# Altium footprint library Semi-ATE.PcbLib: 155 footprints (part 2 of 10)
Each footprint in its own frame and in the unit in brackets; x right, y up, seen from the top. Pads: shape width x height; smd on the part's side, far side on the other; paste and mask are expansions set on the pad; w line width, h text height; cw(c..) or ccw(c..) is an arc to the next point about the centre after c.
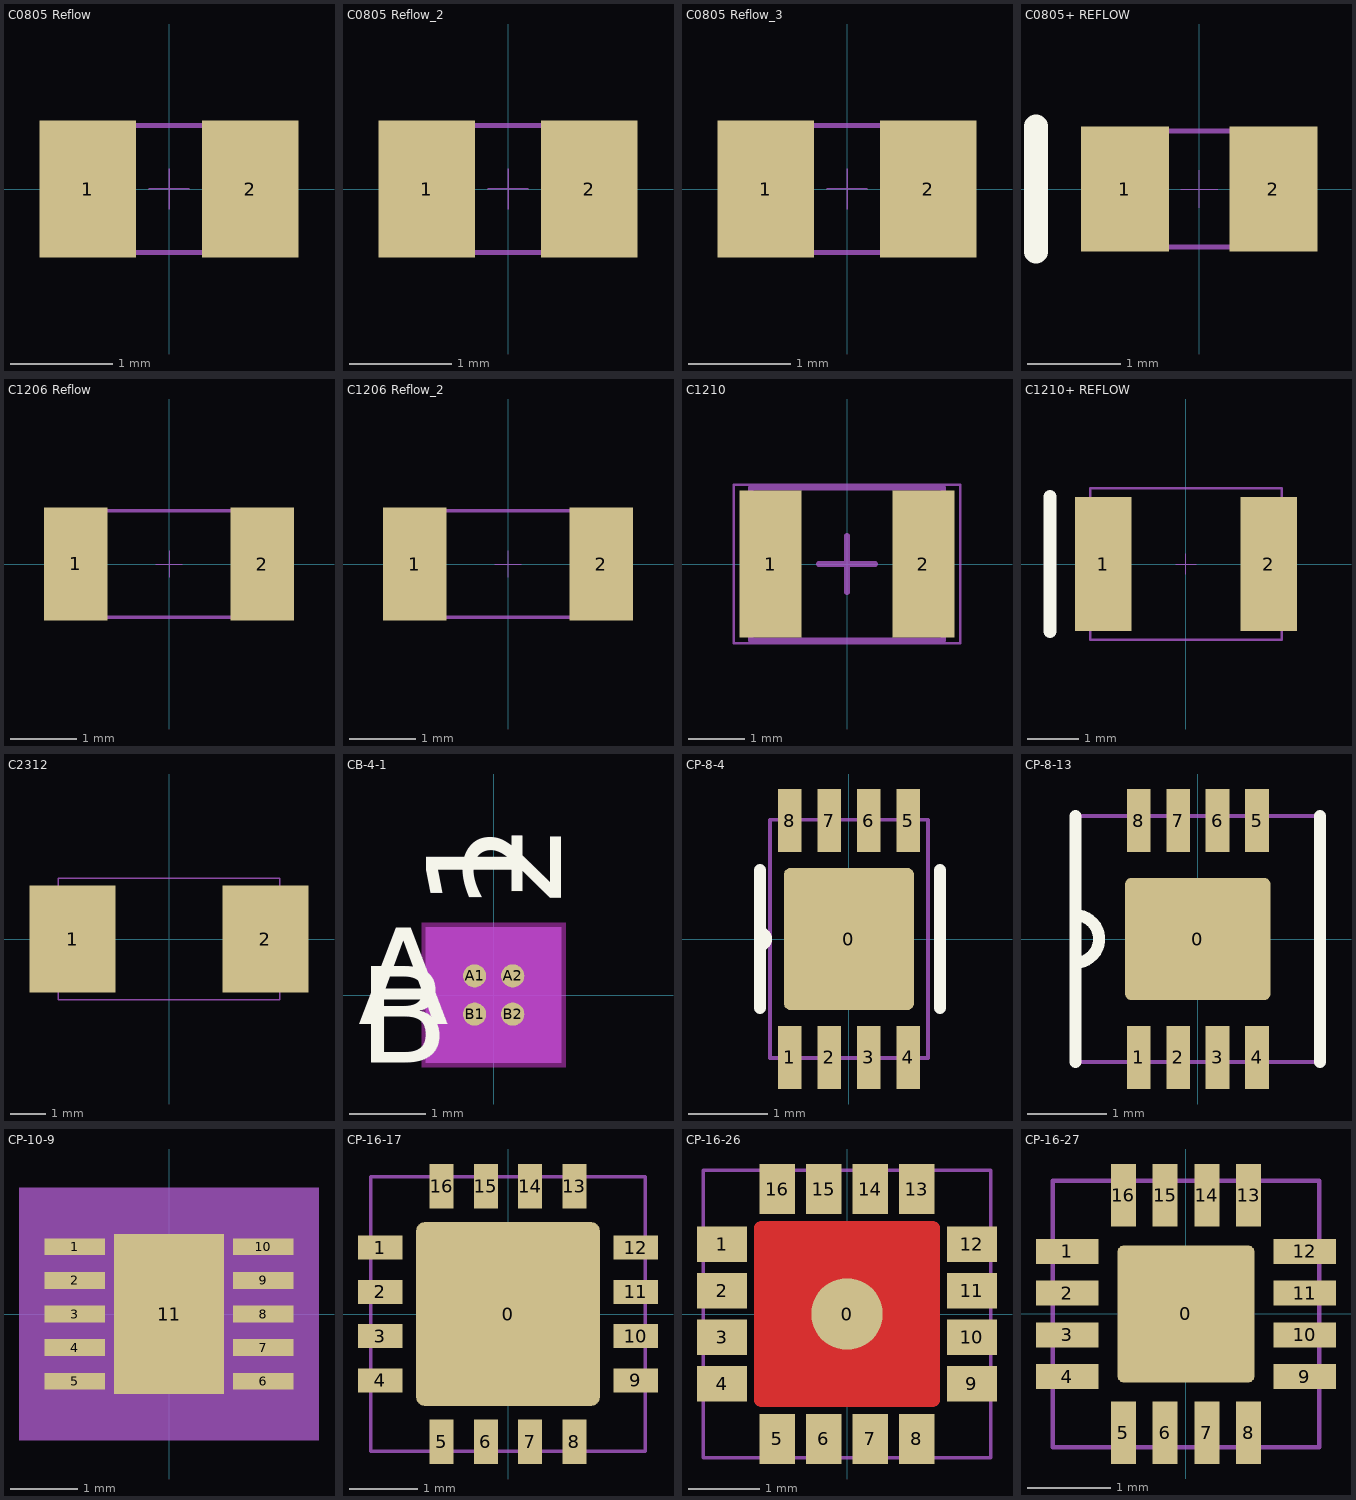
[diagram p1: the footprints below, top view; thin cyan lines are the x and y axes]

## C0805 Reflow [mm] "SMT Capacitor 0805 Reflow Soldering"
height 10
pads (2):
  rect 0.95x1.35 smd: 1(-0.8,0) 2(0.8,0)
Top Designator:
  text ".Designator" at -7.618,-0.508 h1.52
Top 3D Body:
  lines w0.05: -1,-0.625 1,-0.625 1,0.625 -1,0.625 -1,-0.625
Bottom Gold Plating:
  lines w0.013: -0.2,0 0.2,0 ; 0,-0.2 0,0.2
3D body "C0805.STEP": height 0.6, standoff 0, extent -1,-0.625 1,0.625

## C0805 Reflow_2 [mm]
pads (2):
  rect 0.95x1.35 smd: 1(-0.8,0) 2(0.8,0)
Top Designator:
  text ".Designator" at -7.618,-0.508 h1.52
Top 3D Body:
  lines w0.05: -1,-0.625 1,-0.625 1,0.625 -1,0.625 -1,-0.625
Bottom Gold Plating:
  lines w0.013: -0.2,0 0.2,0 ; 0,-0.2 0,0.2
3D body "C0805.STEP": height 0.6, standoff 0, extent -1,-0.625 1,0.625

## C0805 Reflow_3 [mm]
pads (2):
  rect 0.95x1.35 smd: 1(-0.8,0) 2(0.8,0)
Top Designator:
  text ".Designator" at -7.618,-0.508 h1.52
Top 3D Body:
  lines w0.05: -1,-0.625 1,-0.625 1,0.625 -1,0.625 -1,-0.625
Bottom Gold Plating:
  lines w0.013: -0.2,0 0.2,0 ; 0,-0.2 0,0.2
3D body "C0805.STEP": height 0.6, standoff 0, extent -1,-0.625 1,0.625

## C0805+ REFLOW [mm] "SMT Capacitor 0805 Polarized Reflow Soldering"
pads (2):
  rect 0.95x1.35 smd: 1(-0.8,0) 2(0.8,0)
Top Overlay:
  lines w0.254: -1.758,-0.675 -1.758,0.675
Top Designator:
  text ".Designator" at -7.872,-0.508 h1.52
Top 3D Body:
  lines w0.05: -1,-0.625 1,-0.625 1,0.625 -1,0.625 -1,-0.625
Bottom Gold Plating:
  lines w0.013: -0.2,0 0.2,0 ; 0,-0.2 0,0.2
3D body "C0805.STEP": height 0.6, standoff 0, extent -1,-0.625 1,0.625

## C1206 Reflow [mm] "SMT Capacitor 1206 Reflow Soldering"
height 1.35
pads (2):
  rect 0.95x1.7 smd: 1(-1.4,0) 2(1.4,0)
Top Designator:
  text ".Designator" at -7.618,-0.508 h1.52
Top 3D Body:
  lines w0.05: -1.6,-0.8 -1.6,0.8 1.6,0.8 1.6,-0.8 -1.6,-0.8
Bottom Gold Plating:
  lines w0.013: -0.2,0 0.2,0 ; 0,-0.2 0,0.2
3D body "C1206.STEP": height 0.78, standoff 0, extent -1.6,-0.8 1.6,0.8

## C1206 Reflow_2 [mm]
pads (2):
  rect 0.95x1.7 smd: 1(-1.4,0) 2(1.4,0)
Top Designator:
  text ".Designator" at -7.618,-0.508 h1.52
Top 3D Body:
  lines w0.05: -1.6,-0.8 -1.6,0.8 1.6,0.8 1.6,-0.8 -1.6,-0.8
Bottom Gold Plating:
  lines w0.013: -0.2,0 0.2,0 ; 0,-0.2 0,0.2
3D body "C1206.STEP": height 0.78, standoff 0, extent -1.6,-0.8 1.6,0.8

## C1210 [mm] "Chip Capacitor; Body 3.2x2.5mm (LxW typ), IPC High Density"
height 1.35
pads (2):
  rect 1.1x2.6 smd: 1(-1.35,0) 2(1.35,0)
Top Designator:
  text ".Designator" at -7.618,-0.508 h1.52
Top 3D Body:
  lines w0.05: -2,-1.4 2,-1.4 2,1.4 -2,1.4 -2,-1.4
Bottom 3D Body:
  lines w0.1: -1.7,-1.35 1.7,-1.35 1.7,1.35 -1.7,1.35 -1.7,-1.35
Bottom Gold Plating:
  lines w0.1: -0.5,0 0.5,0 ; 0,-0.5 0,0.5
3D body: height 1.35, standoff 0, extent -1.7,-1.35 1.7,1.35

## C1210+ REFLOW [mm] "SMT Capacitor 1210 Polarized Reflow Soldering"
pads (2):
  rect 1.1x2.6 smd: 1(-1.6,0) 2(1.6,0)
Top Overlay:
  lines w0.254: -2.633,-1.3 -2.633,1.3
Top Designator:
  text ".Designator" at -7.871,-0.508 h1.52
Top 3D Body:
  lines w0.05: -1.85,-1.465 1.85,-1.465 1.85,1.465 -1.85,1.465 -1.85,-1.465
Bottom Gold Plating:
  lines w0.013: -0.2,0 0.2,0 ; 0,-0.2 0,0.2
3D body "C1210+.STEP": height 2.03, standoff 0, extent -1.85,-1.465 1.85,1.465

## C2312 [mm] "SMT 2312 Tantalum"
pads (2):
  rect 2.4x3 smd: 1(-2.7,0) 2(2.7,0)
Top Overlay:
  text "." at -2.9,-2 h1
Top Designator:
  text ".Designator" at -7.618,-0.772 h1.52
Top 3D Body:
  lines w0.05: -3.1,-1.7 3.1,-1.7 3.1,1.7 -3.1,1.7 -3.1,-1.7
3D body "TR3C.STEP": height 2.7, standoff 0, extent -3.05,-1.675 3.05,1.675

## CB-4-1 [mm] "4-Ball WLCSP"
pads (4):
  round 0.305 smd paste+0 mask+0: A1(-0.25,0.25) A2(0.25,0.25) B1(-0.25,-0.25) B2(0.25,-0.25)
Top Overlay:
  text "2" at 0.885,1.143 h1.27
  text "1" at 0.385,1.143 h1.27
  text "B" at -1.778,-0.885 h1.27
  text "A" at -1.778,-0.385 h1.27
Bottom Overlay:
  text "2" at -0.385,1.143 h1.27
  text "1" at -0.885,1.143 h1.27
  text "B" at -1.143,-0.885 h1.27
  text "A" at -1.143,-0.385 h1.27
Keep-Out Layer:
  region: -0.944,-0.944 -0.944,0.944 0.944,0.944 0.944,-0.944
Top Designator:
  text ".Designator" at -8.17,0.044 h1.52
Top 3D Body:
  region: 0.889,-0.889 -0.889,-0.889 -0.889,0.889 0.889,0.889
Bottom 3D Body:
  lines w0.025: -0.508,0.258 -0.258,0.508 ; -0.508,-0.508 -0.508,0.508 0.508,0.508 0.508,-0.508 -0.508,-0.508
  text "2" at 0.885,1.143 h1.27
  text "1" at 0.385,1.143 h1.27
  text "B" at -1.778,-0.885 h1.27
  text "A" at -1.778,-0.385 h1.27
Bottom Component Outline:
  region: 0.762,-0.762 -0.762,-0.762 -0.762,0.762 0.762,0.762
  lines w0.152: -0.762,-0.762 0.762,-0.762 0.762,0.762 -0.762,0.762 -0.762,-0.762
3D body "CB_4_1_ADI.step": height 0.69, standoff 0, extent -0.508,-0.508 0.508,0.508
3D body: height 0.25, standoff 0, extent 0,0 0.254,0.254

## CP-8-4 [mm] "8-Lead LFCSP_WD (2x3mm)"
pads (9):
  rrect10% 1.65x1.8 smd: 0(0,0)
  rect 0.3x0.8 smd: 1(-0.75,-1.5) 2(-0.25,-1.5) 3(0.25,-1.5) 4(0.75,-1.5) 5(0.75,1.5) 6(0.25,1.5) 7(-0.25,1.5) 8(-0.75,1.5)
Top Overlay:
  lines w0.152: -1.125,-0.875 -1.125,0.875 ; -1.125,-0.075 ccw(c-1.125,0) -1.125,0.075 ; 1.15,-0.875 1.15,0.875
Top Designator:
  text ".Designator" at -7.605,-0.508 h1.52
Top 3D Body:
  lines w0.05: -1,-1.51 1,-1.51 1,1.51 -1,1.51 -1,-1.51
3D body "CP-8-4.STEP": height 0.75, standoff 0, extent -1,-1.51 1,1.51

## CP-8-13 [mm] "8-Lead LFCSP (3X3)"
pads (9):
  rrect10% 1.84x1.55 smd: 0(0,0)
  rect 0.3x0.8 smd: 1(-0.75,-1.5) 2(-0.25,-1.5) 3(0.25,-1.5) 4(0.75,-1.5) 5(0.75,1.5) 6(0.25,1.5) 7(-0.25,1.5) 8(-0.75,1.5)
Top Overlay:
  lines w0.152: -1.55,-1.56 -1.55,1.56 ; -1.55,-0.3 ccw(c-1.55,0) -1.55,0.3 ; 1.55,-1.56 1.55,1.56
Top Designator:
  text ".Designator" at -7.617,-0.508 h1.52
Top 3D Body:
  lines w0.05: -1.55,-1.56 1.55,-1.56 1.55,1.56 -1.55,1.56 -1.55,-1.56
3D body "CP-8-13.STEP": height 0.85, standoff 0, extent -1.55,-1.56 1.55,1.56

## CP-10-9 [mm] "10-LFCSP (3x3)"
pads (11):
  rect 0.9x0.25 smd paste+0 mask+0: 1(-1.4,1) 2(-1.4,0.5) 3(-1.4,0) 4(-1.4,-0.5) 5(-1.4,-1) 6(1.4,-1) 7(1.4,-0.5) 8(1.4,0) 9(1.4,0.5) 10(1.4,1)
  rect 1.64x2.38 smd paste+0 mask+0: 11(0,0)
Top Overlay:
  text "." at -1.524,1.397 h3
Top Designator:
  text ".Designator" at -7.618,-0.508 h1.52
Top 3D Body:
  region: 2.231,-1.881 -2.231,-1.881 -2.231,1.881 2.231,1.881
Bottom Component Outline:
  region: -1.754,-1.379 -2.104,-1.379 -2.104,1.379 -1.754,1.379 -1.754,1.754 1.754,1.754 1.754,1.379 2.104,1.379 2.104,-1.379 1.754,-1.379 1.754,-1.754 -1.754,-1.754
  lines w0.152: -2.104,-1.379 -2.104,1.379 -1.754,1.379 -1.754,1.754 1.754,1.754 1.754,1.379 2.104,1.379 2.104,-1.379 1.754,-1.379 1.754,-1.754 -1.754,-1.754 -1.754,-1.379 -2.104,-1.379
3D body: height 0.25, standoff 0, extent 0,0 0.254,0.254
3D body "CP_10_9_ADI.step": height 0.75, standoff 0, extent -1.55,-1.5 1.55,1.5

## CP-16-17 [mm] "16 lead LFCSP 4x4mm"
height 0.8
pads (17):
  rrect10% 2.7x2.7 smd paste-2.7: 0(0,0)
  rect 0.65x0.35 smd: 1(-1.875,0.975) 2(-1.875,0.325) 3(-1.875,-0.325) 4(-1.875,-0.975) 9(1.875,-0.975) 10(1.875,-0.325) 11(1.875,0.325) 12(1.875,0.975)
  rect 0.35x0.65 smd: 5(-0.975,-1.875) 6(-0.325,-1.875) 7(0.325,-1.875) 8(0.975,-1.875) 13(0.975,1.875) 14(0.325,1.875) 15(-0.325,1.875) 16(-0.975,1.875)
Top Overlay:
  text "." at -1.863,1.668 h1
Top Paste:
  rectangle: -1.25,-1.25 -0.25,-0.25
  rectangle: 0.25,-1.25 1.25,-0.25
  rectangle: 0.25,0.25 1.25,1.25
  rectangle: -1.25,0.25 -0.25,1.25
Top Solder:
  rectangle: -1.5,-1.5 1.5,1.5
Top Designator:
  text ".Designator" at -7.618,-0.508 h1.52
Top 3D Body:
  lines w0.05: -2.01,-2.01 2.01,-2.01 2.01,2.01 -2.01,2.01 -2.01,-2.01
3D body "CP-16-17.STEP": height 0.75, standoff 0, extent -2.01,-2.01 2.01,2.01

## CP-16-26 [mm] "Analog Devices 16 lead LFCSP 4x4mm 0.75mm height"
pads (17):
  round 1 smd paste-1 mask+0: 0(0,0)
  rect 0.7x0.5 smd: 1(-1.75,0.975) 2(-1.75,0.325) 3(-1.75,-0.325) 4(-1.75,-0.975) 9(1.75,-0.975) 10(1.75,-0.325) 11(1.75,0.325) 12(1.75,0.975)
  rect 0.5x0.7 smd: 5(-0.975,-1.75) 6(-0.325,-1.75) 7(0.325,-1.75) 8(0.975,-1.75) 13(0.975,1.75) 14(0.325,1.75) 15(-0.325,1.75) 16(-0.975,1.75)
Top Layer:
  region: -1.3,1.2 -1.3,1.22 -1.285,1.257 -1.257,1.285 -1.22,1.3 -1.2,1.3 1.2,1.3 1.22,1.3 1.257,1.285 1.285,1.257 1.3,1.22 1.3,1.2 1.3,-1.2 1.3,-1.22 1.285,-1.257 1.257,-1.285 1.22,-1.3 1.2,-1.3 -1.2,-1.3 -1.22,-1.3 -1.257,-1.285 -1.285,-1.257 -1.3,-1.22 -1.3,-1.2
Top Overlay:
  text "." at -2.05,2.05 h1
Top Paste:
  region: 1.225,-1.225 0.5,-1.225 0.5,1.225 1.225,1.225
  region: -1.225,1.225 -0.5,1.225 -0.5,-1.225 -1.225,-1.225
Top Solder:
  region: -1.325,1.325 1.325,1.325 1.325,-1.325 -1.325,-1.325
Top Designator:
  text ".Designator" at -7.669,-0.457 h1.52
Top 3D Body:
  lines w0.05: -2.01,-2.01 2.01,-2.01 2.01,2.01 -2.01,2.01 -2.01,-2.01
3D body "CP-16-26.STEP": height 0.75, standoff 0, extent -2.01,-2.01 2.01,2.01

## CP-16-27 [mm] "16 lead LFCSP"
height 0.8
pads (17):
  rrect10% 1.65x1.65 smd: 0(0,0)
  rect 0.75x0.3 smd: 1(-1.425,0.75) 2(-1.425,0.25) 3(-1.425,-0.25) 4(-1.425,-0.75) 9(1.425,-0.75) 10(1.425,-0.25) 11(1.425,0.25) 12(1.425,0.75)
  rect 0.3x0.75 smd: 5(-0.75,-1.425) 6(-0.25,-1.425) 7(0.25,-1.425) 8(0.75,-1.425) 13(0.75,1.425) 14(0.25,1.425) 15(-0.25,1.425) 16(-0.75,1.425)
Top Overlay:
  text "." at -1.6,1.4 h1
Top Designator:
  text ".Designator" at -7.618,-0.508 h1.52
Top 3D Body:
  lines w0.05: -1.6,-1.6 -1.6,1.6 1.6,1.6 1.6,-1.6 -1.6,-1.6
3D body "CP-16-27.STEP": height 0.8, standoff 0, extent -1.56,-1.56 1.56,1.56